# Altium footprint library my Library.PcbLib: 1247 footprints (part 21 of 78)
Each footprint in its own frame and in the unit in brackets; x right, y up, seen from the top. Pads: shape width x height; smd on the part's side, far side on the other; paste and mask are expansions set on the pad; w line width, h text height; cw(c..) or ccw(c..) is an arc to the next point about the centre after c.
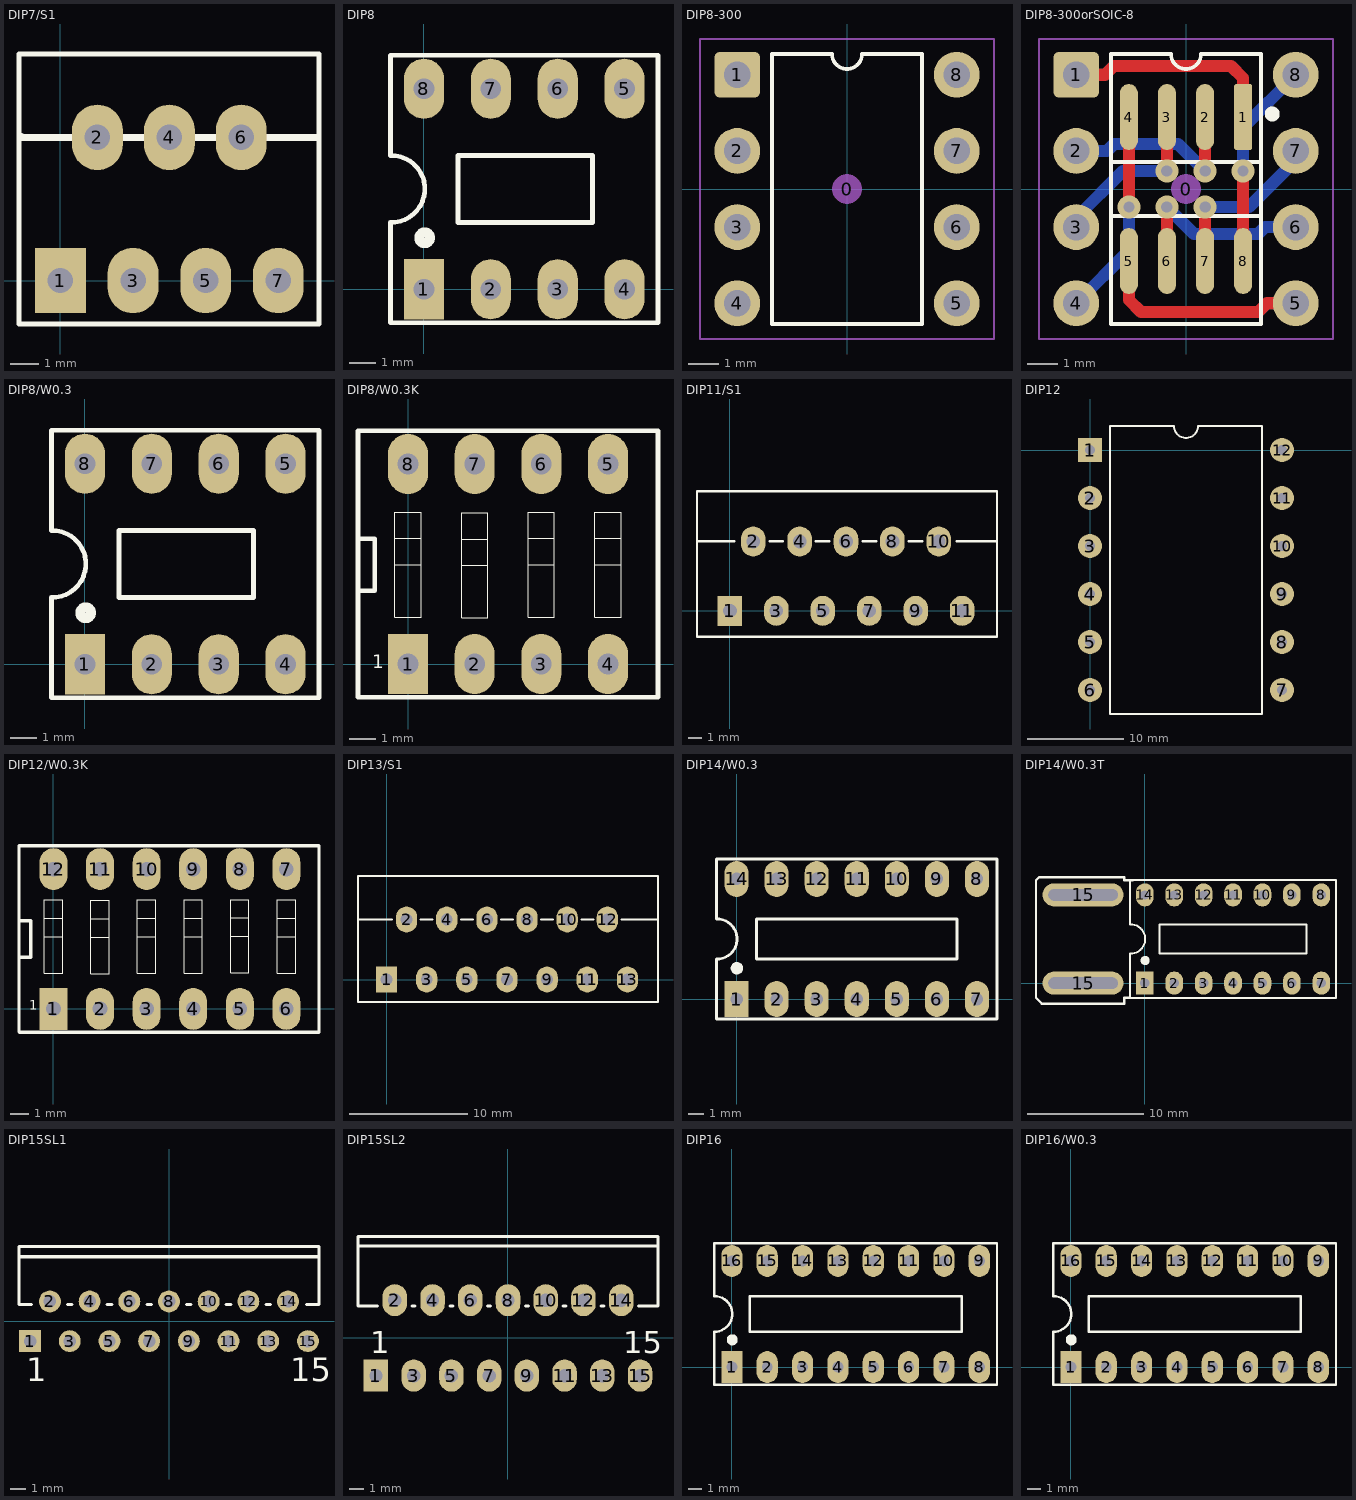
[diagram p20: the footprints below, top view; thin cyan lines are the x and y axes]

## DIP7/S1 [mil]
pads (7):
  rect 70x90 hole 35: 1(0,0)
  oval 70x90 hole 35: 2(51,197) 3(100,0) 4(150,197) 5(200,0) 6(249,197) 7(300,0)
Top Overlay:
  lines w7: -57,-60 -57,312 356,312 356,-60 -57,-60
  lines w10: -54,198 -54,197 354,197
3D body "User Library-TO-220(T).STEP": height 756.77, standoff -77.87, extent -50.57,-11.02 351,311.02

## DIP8 [mil]
pads (8):
  rect 60x90 hole 31: 1(0,0)
  oval 60x90 hole 31: 2(100,0) 3(200,0) 4(300,0) 5(300,300) 6(200,300) 7(100,300) 8(0,300)
Top Overlay:
  circle w15: c1,77 r8
  lines w7: -50.38,100.05 ccw(c-48.69,150.02) -50,200 ; -50,100 -50,-50 350,-50 350,350 -50,350 -50,201 ; 51,100 51,200 252,200 252,100 51,100
3D body "SW3dPS-DIP8-CER.STEP": height 201.25, standoff -129.47, extent -50,-40 350,336.4

## DIP8-300 [mil] "DIP, 8-Leads, 0.300\" lead span , 0.100\" lead pitch, IPC Density A"
height 210
pads (9):
  round 39.37 on Mech15: 0(0,0)
  rrect25% 60x60 hole 35: 1(-144,150)
  round 60 hole 35: 2(-144,50) 3(-144,-50) 4(-144,-150) 5(144,-150) 6(144,-50) 7(144,50) 8(144,150)
Top Overlay:
  lines w5: -98.43,-177.17 98.43,-177.17 98.43,177.17 19.69,177.17 cw(c0,177.17) -19.69,177.17 -98.43,177.17 -98.43,-177.17
Mechanical 13:
  lines w3: -98.43,-177.17 -98.43,177.17 -19.69,177.17 ccw(c0,177.17) 19.69,177.17 98.43,177.17 98.43,-177.17 -98.43,-177.17
Mechanical 15:
  lines w3: -192.91,-196.85 192.91,-196.85 192.91,196.85 -192.91,196.85 -192.91,-196.85
3D body "SW3DPS-DIP8-DEFAULT.STEP": height 165, standoff -105, extent -149,-225 161,225

## DIP8-300orSOIC-8 [mil] "DIP, 8-Leads, 0.300\" lead span , 0.100\" lead pitch, IPC Density A"
height 210
pads (17):
  round 39.37 on Mech15: 0(0,0)
  rrect25% 60x60 hole 35: 1(-144,150)
  rrect25% 23.62x86.61 smd paste-78.74: 1(75,94.49)
  round 60 hole 35: 2(-144,50) 3(-144,-50) 4(-144,-150) 5(144,-150) 6(144,-50) 7(144,50) 8(144,150)
  oval 23.62x86.61 smd paste-78.74: 2(25,94.49) 3(-25,94.49) 4(-75,94.49) 5(-75,-94.49) 6(-25,-94.49) 7(25,-94.49) 8(75,-94.49)
via -74.8,-23.62 diameter 30 hole 15
via 74.8,23.62 diameter 30 hole 15
via -25,23.62 diameter 30 hole 15
via 25,23.62 diameter 30 hole 15
via -25,-23.62 diameter 30 hole 15
via 25,-23.62 diameter 30 hole 15
Top Layer:
  lines w16: -144,150 -106.3,150 -94.88,161.42 59.06,161.42 75,145.47 75,94.49 ; -75,-94.49 -75,-145.47 -59.06,-161.42 94.88,-161.42 106.3,-150 144,-150 ; -75,-23.43 -75,94.49 ; -25,-94.49 -25,-23.62 ; -25,23.62 -25,94.49 ; 25,-94.49 25,-23.62 ; 25,23.62 25,94.49 ; 75,-94.49 75,23.43
Bottom Layer:
  lines w16: -144,-150 -74.8,-80.8 -74.8,-23.62 ; -144,-50 -144,-37.7 -82.68,23.62 -25,23.62 ; -144,50 -103.54,50 -94.49,59.06 -10.43,59.06 25,23.62 ; -25,-23.62 10.43,-59.06 94.49,-59.06 103.54,-50 144,-50 ; 25,-23.62 82.68,-23.62 132.68,26.38 132.68,50 144,50 ; 74.8,23.62 74.8,80.8 144,150
Top Overlay:
  circle w9.84: c113.19,98.43 r4.92
  lines w5: -98.43,-177.17 98.43,-177.17 98.43,177.17 19.69,177.17 cw(c0,177.17) -19.69,177.17 -98.43,177.17 -98.43,-177.17 ; -98.43,-35.43 -98.43,35.43 98.43,35.43 98.43,-35.43 -98.43,-35.43
Top Paste:
  region: 65.55,129.13 65.55,59.84 84.45,59.84 84.45,129.13
  region: 15.55,129.13 15.55,59.84 34.45,59.84 34.45,129.13
  region: -34.45,129.13 -34.45,59.84 -15.55,59.84 -15.55,129.13
  region: -84.45,129.13 -84.45,59.84 -65.55,59.84 -65.55,129.13
  region: 65.55,-59.84 65.55,-129.13 84.45,-129.13 84.45,-59.84
  region: 15.55,-59.84 15.55,-129.13 34.45,-129.13 34.45,-59.84
  region: -34.45,-59.84 -34.45,-129.13 -15.55,-129.13 -15.55,-59.84
  region: -84.45,-59.84 -84.45,-129.13 -65.55,-129.13 -65.55,-59.84
Mechanical 13:
  lines w3: -98.43,-177.17 -98.43,177.17 -19.69,177.17 ccw(c0,177.17) 19.69,177.17 98.43,177.17 98.43,-177.17 -98.43,-177.17
Mechanical 15:
  lines w3: -192.91,-196.85 192.91,-196.85 192.91,196.85 -192.91,196.85 -192.91,-196.85
3D body "SW3DPS-DIP8-DEFAULT.STEP": height 165, standoff -105, extent -149,-225 161,225

## DIP8/W0.3 [mil] "8 PIN, W 300mil, Pin to pin 100mil"
height 100
pads (8):
  rect 60x90 hole 31: 1(0,0)
  oval 60x90 hole 31: 2(100,0) 3(200,0) 4(300,0) 5(300,300) 6(200,300) 7(100,300) 8(0,300)
Top Overlay:
  circle w15: c1,77 r8
  lines w7: -50.38,100.05 ccw(c-48.69,150.02) -50,200 ; -50,100 -50,-50 350,-50 350,350 -50,350 -50,201 ; 51,100 252,100 252,200 51,200 51,100
3D body "SW3dPS-DIP8-CER.STEP": height 201.25, standoff -129.47, extent -50,-40 350,336.4

## DIP8/W0.3K [mil] "8 PIN, W 400mil , L 450mil, Pin to pin 100mil For Switch"
height 100
pads (8):
  rect 60x90 hole 31: 1(0,0)
  oval 60x90 hole 31: 2(100,0) 3(200,0) 4(300,0) 5(300,300) 6(200,300) 7(100,300) 8(0,300)
Top Overlay:
  lines w1.5: -19.68,149 19.68,149 ; -19.68,188.37 19.68,188.37 ; 80.31,148 119.69,148 ; 80.31,187.37 119.69,187.37 ; 180.31,149 219.69,149 ; 180.31,188.37 219.69,188.37 ; 280.31,149 319.69,149 ; 280.31,188.37 319.69,188.37 ; -19.68,70.26 19.68,70.26 19.68,227.74 -19.68,227.74 -19.68,70.26 ; 80.31,69.26 119.69,69.26 119.69,226.74 80.31,226.74 80.31,69.26 ; 180.31,70.26 219.69,70.26 219.69,227.74 180.31,227.74 180.31,70.26 ; 280.31,70.26 319.69,70.26 319.69,227.74 280.31,227.74 280.31,70.26
  lines w7: -75,68.5 -75,233 ; -75,110 -50,110 -50,188 -74,188 -75,189 ; -75,126 -75,-50 375,-50 375,350 -75,350 -75,176
  text "1" at -54,-6 h20
3D body "switch 4bank x1.STEP": height 158.27, standoff -9.84, extent -80,-45.08 377.87,345.08

## DIP11/S1 [mm] "11 Pin so le hai hang cach nhau 200mil., Pin to pin 100mil"
pads (11):
  rect 1.8x2.2 hole 1: 1(0,0)
  oval 1.8x2.2 hole 1: 2(1.7,5.08) 3(3.4,0) 4(5.1,5.08) 5(6.8,0) 6(8.5,5.08) 7(10.2,0) 8(11.9,5.08) 9(13.6,0) 10(15.3,5.08) 11(17,0)
Top Overlay:
  lines w0.178: -2.413,5.08 0.33,5.08 ; 2.896,5.08 3.886,5.08 ; 6.299,5.08 7.29,5.08 ; 9.728,5.08 10.719,5.08 ; 13.081,5.08 14.072,5.08 ; 16.612,5.08 19.558,5.08 ; -2.413,-1.905 -2.413,8.763 19.558,8.763 19.558,-1.905 -2.413,-1.905

## DIP12 [mm]
pads (12):
  rect 2.5x2.5 hole 1: 1(0,0)
  round 2.5 hole 1: 2(0,-5) 3(0,-10) 4(0,-15) 5(0,-20) 6(0,-25) 7(20,-25) 8(20,-20) 9(20,-15) 10(20,-10) 11(20,-5) 12(20,0)
Top Overlay:
  lines w0.2: 2.085,-27.5 2.085,2.5 8.75,2.5 ccw(c10,2.5) 11.25,2.5 17.915,2.5 17.915,-27.5 2.085,-27.5

## DIP12/W0.3K [mil] "12 PIN, W 300mil, Pin to pin 100mil For Switch"
height 100
pads (12):
  rect 60x90 hole 31.5: 1(0,0)
  oval 60x90 hole 31.5: 2(100,0) 3(200,0) 4(300,0) 5(400,0) 6(500,0) 7(500,300) 8(400,300) 9(300,300) 10(200,300) 11(100,300) 12(0,300)
Top Overlay:
  lines w1.5: -19.68,155 19.68,155 ; -19.68,194.37 19.68,194.37 ; 80.31,154 119.69,154 ; 80.31,193.37 119.69,193.37 ; 180.31,155 219.69,155 ; 180.31,194.37 219.69,194.37 ; 280.31,155 319.69,155 ; 280.31,194.37 319.69,194.37 ; 380.31,156 419.69,156 ; 380.31,195.37 419.69,195.37 ; 480.31,155 519.68,155 ; 480.31,194.37 519.68,194.37 ; -19.68,76.26 -19.68,233.74 19.68,233.74 19.68,76.26 -19.68,76.26 ; 80.31,75.26 80.31,232.74 119.69,232.74 119.69,75.26 80.31,75.26 ; 180.31,76.26 180.31,233.74 219.69,233.74 219.69,76.26 180.31,76.26 ; 280.31,76.26 280.31,233.74 319.69,233.74 319.69,76.26 280.31,76.26 ; 380.31,77.26 380.31,234.74 419.69,234.74 419.69,77.26 380.31,77.26 ; 480.31,76.26 480.31,233.74 519.68,233.74 519.68,76.26 480.31,76.26
  lines w7: -74,69.5 -74,234 ; -74,111 -49,111 -49,189 -73,189 -74,190 ; -74,125 -74,-49 -73,-50 570,-50 570,350 -74,350 -74,175
  text "1" at -52,-2 h20
3D body "switch 4bank x1.STEP": height 158.27, standoff -9.84, extent -77.87,-45.08 380,345.08

## DIP13/S1 [mm] "13 Pin so le hai hang cach nhau 200mil., Pin to pin 100mil"
pads (13):
  rect 1.8x2.2 hole 1: 1(0,0)
  oval 1.8x2.2 hole 1: 2(1.7,5.08) 3(3.4,0) 4(5.1,5.08) 5(6.8,0) 6(8.5,5.08) 7(10.2,0) 8(11.9,5.08) 9(13.6,0) 10(15.3,5.08) 11(17,0) 12(18.7,5.08) 13(20.4,0)
Top Overlay:
  lines w0.178: -2.413,5.08 0.457,5.08 ; 2.896,5.08 3.886,5.08 ; 6.325,5.08 7.315,5.08 ; 9.703,5.08 10.693,5.08 ; 13.106,5.08 14.097,5.08 ; 16.51,5.08 17.501,5.08 ; 19.888,5.08 22.987,5.08 ; -2.413,-1.905 22.987,-1.905 22.987,8.763 -2.413,8.763 -2.413,-1.905

## DIP14/W0.3 [mil] "14PIN, W 300mil, Pin to pin 100mil"
height 100
pads (14):
  rect 60x90 hole 31: 1(0,0)
  oval 60x90 hole 31: 2(100,0) 3(200,0) 4(300,0) 5(400,0) 6(500,0) 7(600,0) 8(600,300) 9(500,300) 10(400,300) 11(300,300) 12(200,300) 13(100,300) 14(0,300)
Top Overlay:
  circle w15: c1,77 r8
  lines w7: -50.38,100.05 ccw(c-48.69,150.02) -50,200 ; -50,100 -50,-50 650,-50 650,350 -50,350 -50,201 ; 50,100 550,100 550,200 50,200 50,100
3D body "SW3DPS-DIP-14-DEFAULT.STEP": height 159.45, standoff -115.35, extent -75,-10 675,304.96

## DIP14/W0.3T [mm] "14PIN, W 300mil, Pin to pin 100mil"
height 2.54
pads (16):
  rect 1.524x2 hole 0.8: 1(0,0)
  oval 1.524x2 hole 0.8: 2(2.54,0) 3(5.08,0) 4(7.62,0) 5(10.16,0) 6(12.7,0) 7(15.24,0) 8(15.24,7.62) 9(12.7,7.62) 10(10.16,7.62) 11(7.62,7.62) 12(5.08,7.62) 13(2.54,7.62) 14(0,7.62)
  oval 7x2 hole 1 slot 6 at 0 deg: 15(-5.334,0) 15(-5.334,7.62)
Top Overlay:
  circle w0.381: c0.025,1.956 r0.203
  lines w0.178: -1.28,2.541 ccw(c-1.237,3.81) -1.27,5.08 ; -1.27,2.54 -1.27,-1.27 16.51,-1.27 16.51,8.89 -1.27,8.89 -1.27,5.105 ; 1.27,2.54 13.97,2.54 13.97,5.08 1.27,5.08 1.27,2.54
  lines w0.203: -1.27,-1.27 -1.778,-1.27 -1.778,-1.778 -8.89,-1.778 -9.398,-1.27 -9.398,8.89 -9.144,9.144 -1.778,9.144 -1.778,8.89 -1.016,8.89

## DIP15SL1 [mm] "TO, Thru-Hole, Vertical, Heatsink Mounted; 15 Bent Staggered Leads; Pitch 1.27 mm"
height 17.3
pads (15):
  rect 1.4x1.4 hole 0.8: 1(-8.89,-1.27)
  round 1.4 hole 0.8: 2(-7.62,1.27) 3(-6.35,-1.27) 4(-5.08,1.27) 5(-3.81,-1.27) 6(-2.54,1.27) 7(-1.27,-1.27) 8(0,1.27) 9(1.27,-1.27) 10(2.54,1.27) 11(3.81,-1.27) 12(5.08,1.27) 13(6.35,-1.27) 14(7.62,1.27) 15(8.89,-1.27)
Top Overlay:
  lines w0.2: -9.6,4.13 9.6,4.13 ; -8.8,1.08 -9.6,1.08 -9.6,4.78 9.6,4.78 9.6,1.08 8.8,1.08 ; -6.5,1.08 -6.2,1.08 ; -3.96,1.08 -3.66,1.08 ; -1.42,1.08 -1.12,1.08 ; 1.12,1.08 1.42,1.08 ; 3.66,1.08 3.96,1.08 ; 6.2,1.08 6.5,1.08
  text "1" at -9.14,-3.845 h1.5
  text "15" at 7.765,-3.845 h1.5
3D body "User Library-MULTIWAT T15.step": height 22.74, standoff -2.18, extent -9.8,-1.778 9.8,7.29

## DIP15SL2 [mil] "TO, Thru-Hole, Vertical, Heatsink Mounted; 15 Bent Staggered Leads; Pitch 1.27 mm"
height 826.77
pads (15):
  rect 65x85 hole 35.43: 1(-350,-100)
  oval 65x85 hole 35.43: 2(-300,100) 3(-250,-100) 4(-200,100) 5(-150,-100) 6(-100,100) 7(-50,-100) 8(0,100) 9(50,-100) 10(100,100) 11(150,-100) 12(200,100) 13(250,-100) 14(300,100) 15(350,-100)
Top Overlay:
  lines w7.87: -397.64,243.7 397.64,243.7 ; -346.46,84.25 -397.64,84.25 -397.64,269.29 397.64,269.29 397.64,84.25 346.46,84.25 ; -253.94,84.25 -246.06,84.25 ; -153.94,84.25 -146.06,84.25 ; -53.94,84.25 -46.06,84.25 ; 46.06,84.25 53.94,84.25 ; 146.06,84.25 153.94,84.25 ; 246.06,84.25 253.94,84.25
  text "1" at -365,-40 h59.06
  text "15" at 305,-40 h59.06
3D body "SW3dPS-L298N.STEP": height 813.69, standoff -219.3, extent -397.84,-391.63 397.44,140.1

## DIP16 [mil]
pads (16):
  rect 60x90 hole 31: 1(0,0)
  oval 60x90 hole 31: 2(100,0) 3(200,0) 4(300,0) 5(400,0) 6(500,0) 7(600,0) 8(700,0) 9(700,300) 10(600,300) 11(500,300) 12(400,300) 13(300,300) 14(200,300) 15(100,300) 16(0,300)
Top Overlay:
  circle w15: c1,77 r8
  lines w7: -50.38,100.05 ccw(c-48.69,150.02) -50,200 ; -50,100 -50,-50 750,-50 750,350 -49,350 -50,349 ; -50,201 -50,350 ; 50,100 650,100 650,200 50,200 50,100
3D body "SW3dPS-DIP 16 _ socket 214.STEP": height 317.48, standoff -113.06, extent -51.7,-53.39 751.7,360

## DIP16/W0.3 [mil] "16 PIN, W 300mil, Pin to pin 100mil"
height 100
pads (16):
  rect 60x90 hole 31: 1(0,0)
  oval 60x90 hole 31: 2(100,0) 3(200,0) 4(300,0) 5(400,0) 6(500,0) 7(600,0) 8(700,0) 9(700,300) 10(600,300) 11(500,300) 12(400,300) 13(300,300) 14(200,300) 15(100,300) 16(0,300)
Top Overlay:
  circle w15: c1,77 r8
  lines w7: -50.38,100.05 ccw(c-48.69,150.02) -50,200 ; -50,100 -50,-50 750,-50 750,350 -49,350 -50,349 ; -50,201 -50,350 ; 50,100 50,200 650,200 650,100 50,100
3D body "SW3dPS-DIP 16 _ socket 214.STEP": height 317.48, standoff -113.06, extent -51.7,-53.39 751.7,360